# Altium footprint library Board.PcbLib: 30 footprints (part 2 of 2)
Each footprint in its own frame and in the unit in brackets; x right, y up, seen from the top. Pads: shape width x height; smd on the part's side, far side on the other; paste and mask are expansions set on the pad; w line width, h text height; cw(c..) or ccw(c..) is an arc to the next point about the centre after c.
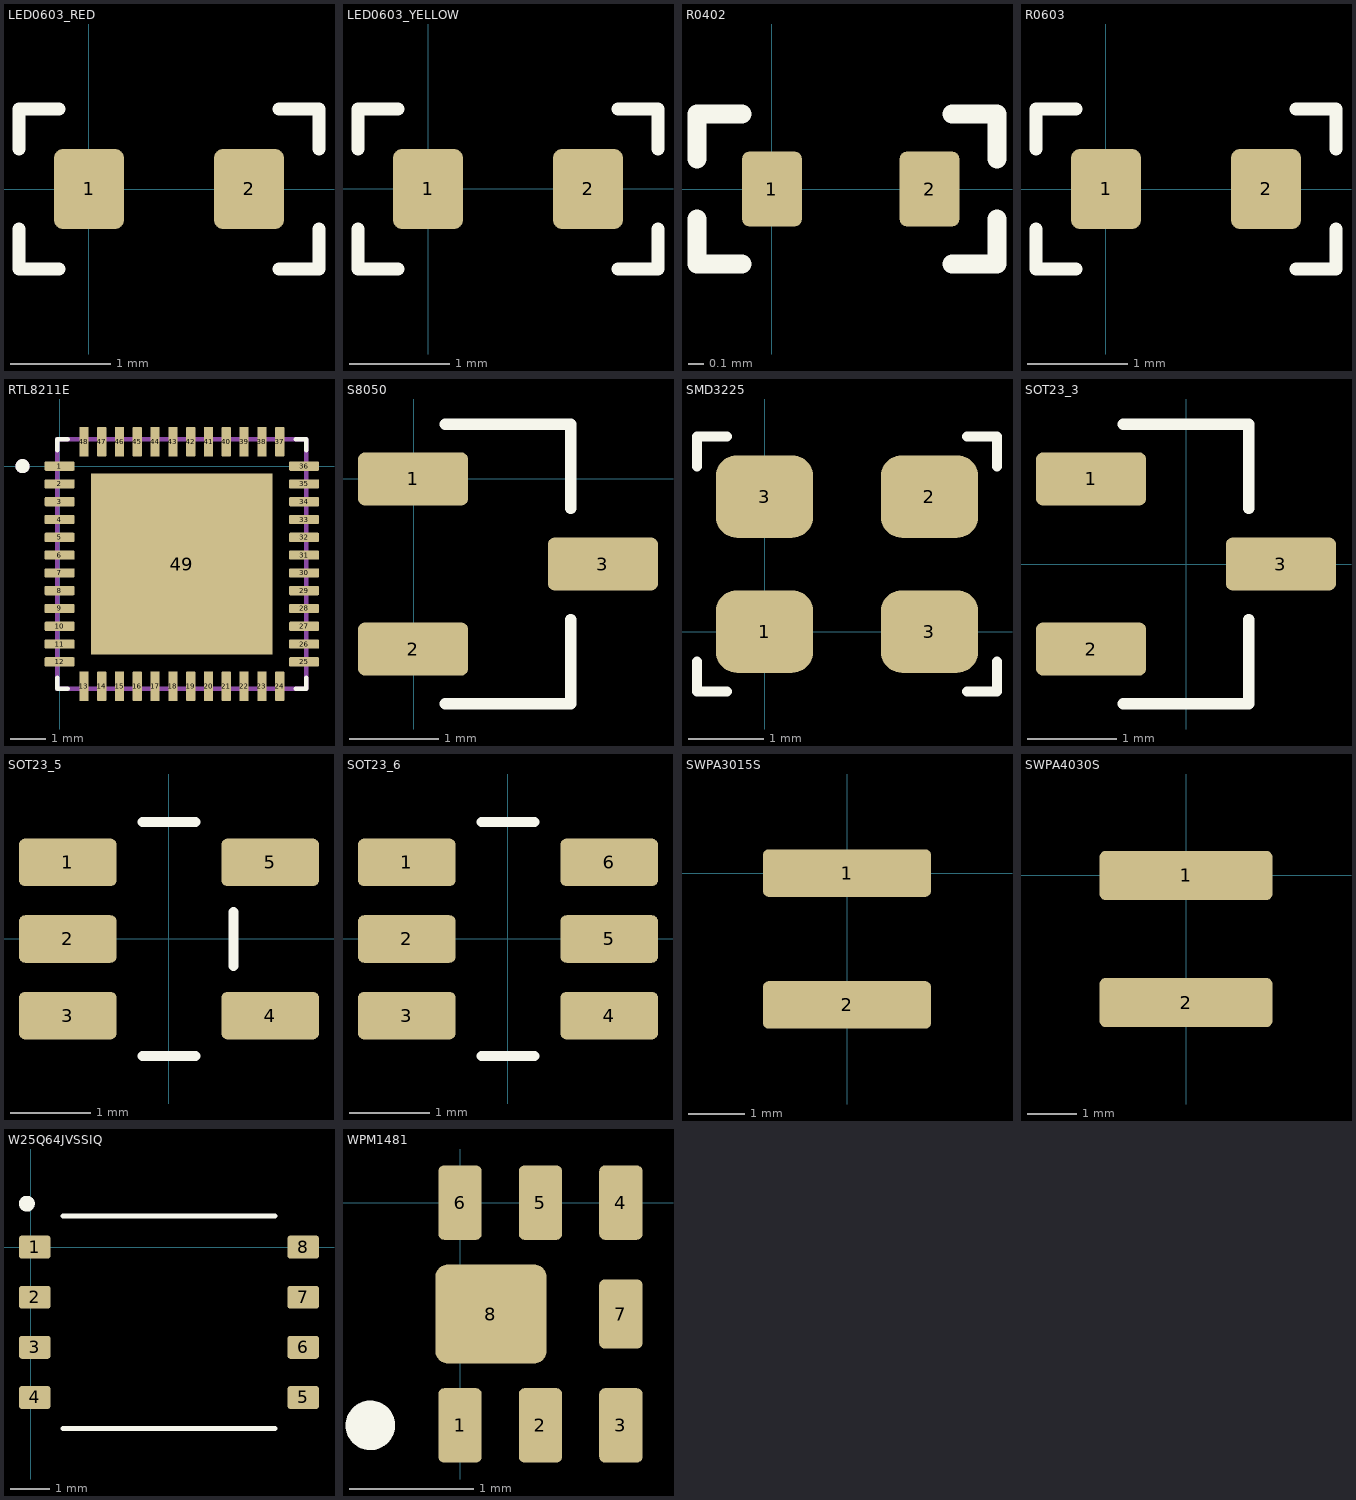
[diagram p1: the footprints below, top view; thin cyan lines are the x and y axes]

## LED0603_RED [mm]
pads (2):
  rrect25% 0.7x0.8 smd: 1(0,0) 2(1.6,0)
Top Overlay:
  lines w0.127: -0.7,-0.4 -0.7,-0.8 -0.3,-0.8 ; -0.7,0.4 -0.7,0.8 -0.3,0.8 ; 1.9,-0.8 2.3,-0.8 2.3,-0.4 ; 1.9,0.8 2.3,0.8 2.3,0.4
3D body "LED 0603玻璃罩.STEP": height 0.61, standoff 0.21, extent 0.225,-0.375 1.425,0.425
3D body "LED 0603-G.STEP": height 0.47, standoff 0, extent 0.025,-0.376 1.625,0.426

## LED0603_YELLOW [mm]
pads (2):
  rrect25% 0.7x0.8 smd: 1(0,0) 2(1.6,0)
Top Overlay:
  lines w0.127: -0.7,-0.4 -0.7,-0.8 -0.3,-0.8 ; -0.7,0.4 -0.7,0.8 -0.3,0.8 ; 1.9,-0.8 2.3,-0.8 2.3,-0.4 ; 1.9,0.8 2.3,0.8 2.3,0.4
3D body "LED 0603-G.STEP": height 0.47, standoff 0, extent 0.025,-0.376 1.625,0.426
3D body "LED 0603玻璃罩.STEP": height 0.61, standoff 0.21, extent 0.225,-0.375 1.425,0.425

## R0402 [mm]
pads (2):
  rrect25% 0.4x0.5 smd: 1(0,0) 2(1.05,0)
Top Overlay:
  lines w0.127: -0.5,-0.2 -0.5,-0.5 -0.2,-0.5 ; -0.5,0.2 -0.5,0.5 -0.2,0.5 ; 1.2,-0.5 1.5,-0.5 1.5,-0.2 ; 1.2,0.5 1.5,0.5 1.5,0.2
3D body "R 0402.STEP": height 0.3, standoff 0, extent 0,-0.25 1,0.25

## R0603 [mm]
pads (2):
  rrect25% 0.7x0.8 smd: 1(0,0) 2(1.6,0)
Top Overlay:
  lines w0.127: -0.7,-0.4 -0.7,-0.8 -0.3,-0.8 ; -0.7,0.4 -0.7,0.8 -0.3,0.8 ; 1.9,-0.8 2.3,-0.8 2.3,-0.4 ; 1.9,0.8 2.3,0.8 2.3,0.4
3D body "R 0603.STEP": height 0.4, standoff 0, extent 0,-0.4 1.6,0.4

## RTL8211E [mm]
pads (49):
  rrect25% 0.84x0.26 smd: 1(0,0) 2(0,-0.5) 3(0,-1) 4(0,-1.5) 5(0,-2) 6(0,-2.5) 7(0,-3) 8(0,-3.5) 9(0,-4) 10(0,-4.5) 11(0,-5) 12(0,-5.5) 25(6.87,-5.5) 26(6.87,-5) 27(6.87,-4.5) 28(6.87,-4) 29(6.87,-3.5) 30(6.87,-3) 31(6.87,-2.5) 32(6.87,-2) 33(6.87,-1.5) 34(6.87,-1) 35(6.87,-0.5) 36(6.87,0)
  rrect25% 0.26x0.84 smd: 13(0.685,-6.185) 14(1.185,-6.185) 15(1.685,-6.185) 16(2.185,-6.185) 17(2.685,-6.185) 18(3.185,-6.185) 19(3.685,-6.185) 20(4.185,-6.185) 21(4.685,-6.185) 22(5.185,-6.185) 23(5.685,-6.185) 24(6.185,-6.185) 37(6.185,0.685) 38(5.685,0.685) 39(5.185,0.685) 40(4.685,0.685) 41(4.185,0.685) 42(3.685,0.685) 43(3.185,0.685) 44(2.685,0.685) 45(2.185,0.685) 46(1.685,0.685) 47(1.185,0.685) 48(0.685,0.685)
  rect 5.1x5.1 smd paste-4: 49(3.435,-2.75)
Top Overlay:
  circle w0.2: c-1.04,0 r0.1
  lines w0.127: -0.065,-5.95 -0.065,-6.25 0.235,-6.25 ; -0.065,0.45 -0.065,0.75 0.235,0.75 ; 6.635,-6.25 6.935,-6.25 6.935,-5.95 ; 6.635,0.75 6.935,0.75 6.935,0.45
Top Paste:
  region: 5.515,-4.83 3.905,-4.83 3.905,-3.22 5.515,-3.22
  region: 2.965,-4.83 1.355,-4.83 1.355,-3.22 2.965,-3.22
  region: 5.515,-2.28 3.905,-2.28 3.905,-0.67 5.515,-0.67
  region: 2.965,-2.28 1.355,-2.28 1.355,-0.67 2.965,-0.67
Mechanical 13:
  circle w0.2: c-1.04,0 r0.1
  lines w0.127: -0.065,-6.25 -0.065,0.75 6.935,0.75 6.935,-6.25 -0.065,-6.25
3D body "step_temp.STEP": height 1, standoff 0, extent -0.065,-6.25 6.935,0.75

## S8050 [mm]
pads (3):
  rrect25% 1.23x0.59 smd: 1(-0.01,0) 2(-0.01,-1.9) 3(2.11,-0.95)
Top Overlay:
  lines w0.127: 0.35,-2.51 1.75,-2.51 1.75,-1.57 ; 0.35,0.61 1.75,0.61 1.75,-0.33
3D body "SOT23_3.STEP": height 1.45, standoff 0, extent -0.35,-2.4 2.45,0.5

## SMD3225 [mm]
pads (4):
  rrect50% 1.3x1.1 smd: 1(0,0) 2(2.2,1.8) 3(0,1.8) 3(2.2,0)
Top Overlay:
  lines w0.127: -0.9,-0.4 -0.9,-0.8 -0.5,-0.8 ; -0.9,2.2 -0.9,2.6 -0.5,2.6 ; 2.7,-0.8 3.1,-0.8 3.1,-0.4 ; 2.7,2.6 3.1,2.6 3.1,2.2
3D body "OSC 3225-4.STEP": height 0.7, standoff -0.02, extent -0.5,-0.35 2.7,2.15

## SOT23_3 [mm]
pads (3):
  rrect25% 1.23x0.59 smd: 1(-1.06,0.95) 2(-1.06,-0.95) 3(1.06,0)
Top Overlay:
  lines w0.127: -0.7,-1.56 0.7,-1.56 0.7,-0.62 ; -0.7,1.56 0.7,1.56 0.7,0.62
3D body "SOT23_3.STEP": height 1.45, standoff 0, extent -1.4,-1.45 1.4,1.45

## SOT23_5 [mm]
pads (5):
  rrect25% 1.21x0.59 smd: 1(-1.255,0.95) 2(-1.255,0) 3(-1.255,-0.95) 4(1.255,-0.95) 5(1.255,0.95)
Top Overlay:
  lines w0.127: -0.33,-1.45 0.33,-1.45 ; -0.33,1.45 0.33,1.45 ; 0.8,-0.335 0.8,0.335
3D body "SOT23_5.STEP": height 1.45, standoff 0, extent -1.4,-1.45 1.4,1.45

## SOT23_6 [mm]
pads (6):
  rrect25% 1.21x0.59 smd: 1(-1.255,0.95) 2(-1.255,0) 3(-1.255,-0.95) 4(1.255,-0.95) 5(1.255,0) 6(1.255,0.95)
Top Overlay:
  lines w0.127: -0.33,-1.45 0.33,-1.45 ; -0.33,1.45 0.33,1.45
3D body "SOT23_6.STEP": height 1.45, standoff 0, extent -1.38,-1.46 1.42,1.44

## SWPA3015S [mm]
pads (2):
  rrect25% 3x0.85 smd: 1(0,0) 2(0,-2.35)
3D body: height 1.5, standoff 0, extent -1.2,-2.5 1.2,0.2

## SWPA4030S [mm]
pads (2):
  rrect25% 3.5x1 smd: 1(0,0) 2(0,-2.57)
3D body: height 1.5, standoff 0, extent -1.4,-2.8 1.4,0.2

## W25Q64JVSSIQ [mm]
pads (8):
  rrect25% 0.8x0.58 smd: 1(0.1,0) 2(0.1,-1.27) 3(0.1,-2.54) 4(0.1,-3.81) 5(6.9,-3.81) 6(6.9,-2.54) 7(6.9,-1.27) 8(6.9,0)
Top Overlay:
  circle w0.2: c-0.1,1.1 r0.1
  lines w0.127: 0.81,-4.59 6.19,-4.59 ; 0.81,0.79 6.19,0.79
3D body: height 0.8, standoff 0, extent 0.5,-4.4 6.5,0.61

## WPM1481 [mm]
pads (8):
  rrect25% 0.35x0.6 smd: 1(0,-1.8) 2(0.65,-1.8) 3(1.3,-1.8) 4(1.3,0) 5(0.65,0) 6(0,0)
  rrect25% 0.35x0.56 smd: 7(1.3,-0.9)
  rrect25% 0.9x0.8 smd: 8(0.25,-0.9)
Top Overlay:
  circle w0.2: c-0.725,-1.8 r0.1
3D body: height 0.6, standoff 0, extent -0.375,-1.825 1.725,0